# Altium footprint library My Footprint 3D.PCBLIB: 447 footprints (part 27 of 29)
Each footprint in its own frame and in the unit in brackets; x right, y up, seen from the top. Pads: shape width x height; smd on the part's side, far side on the other; paste and mask are expansions set on the pad; w line width, h text height; cw(c..) or ccw(c..) is an arc to the next point about the centre after c.
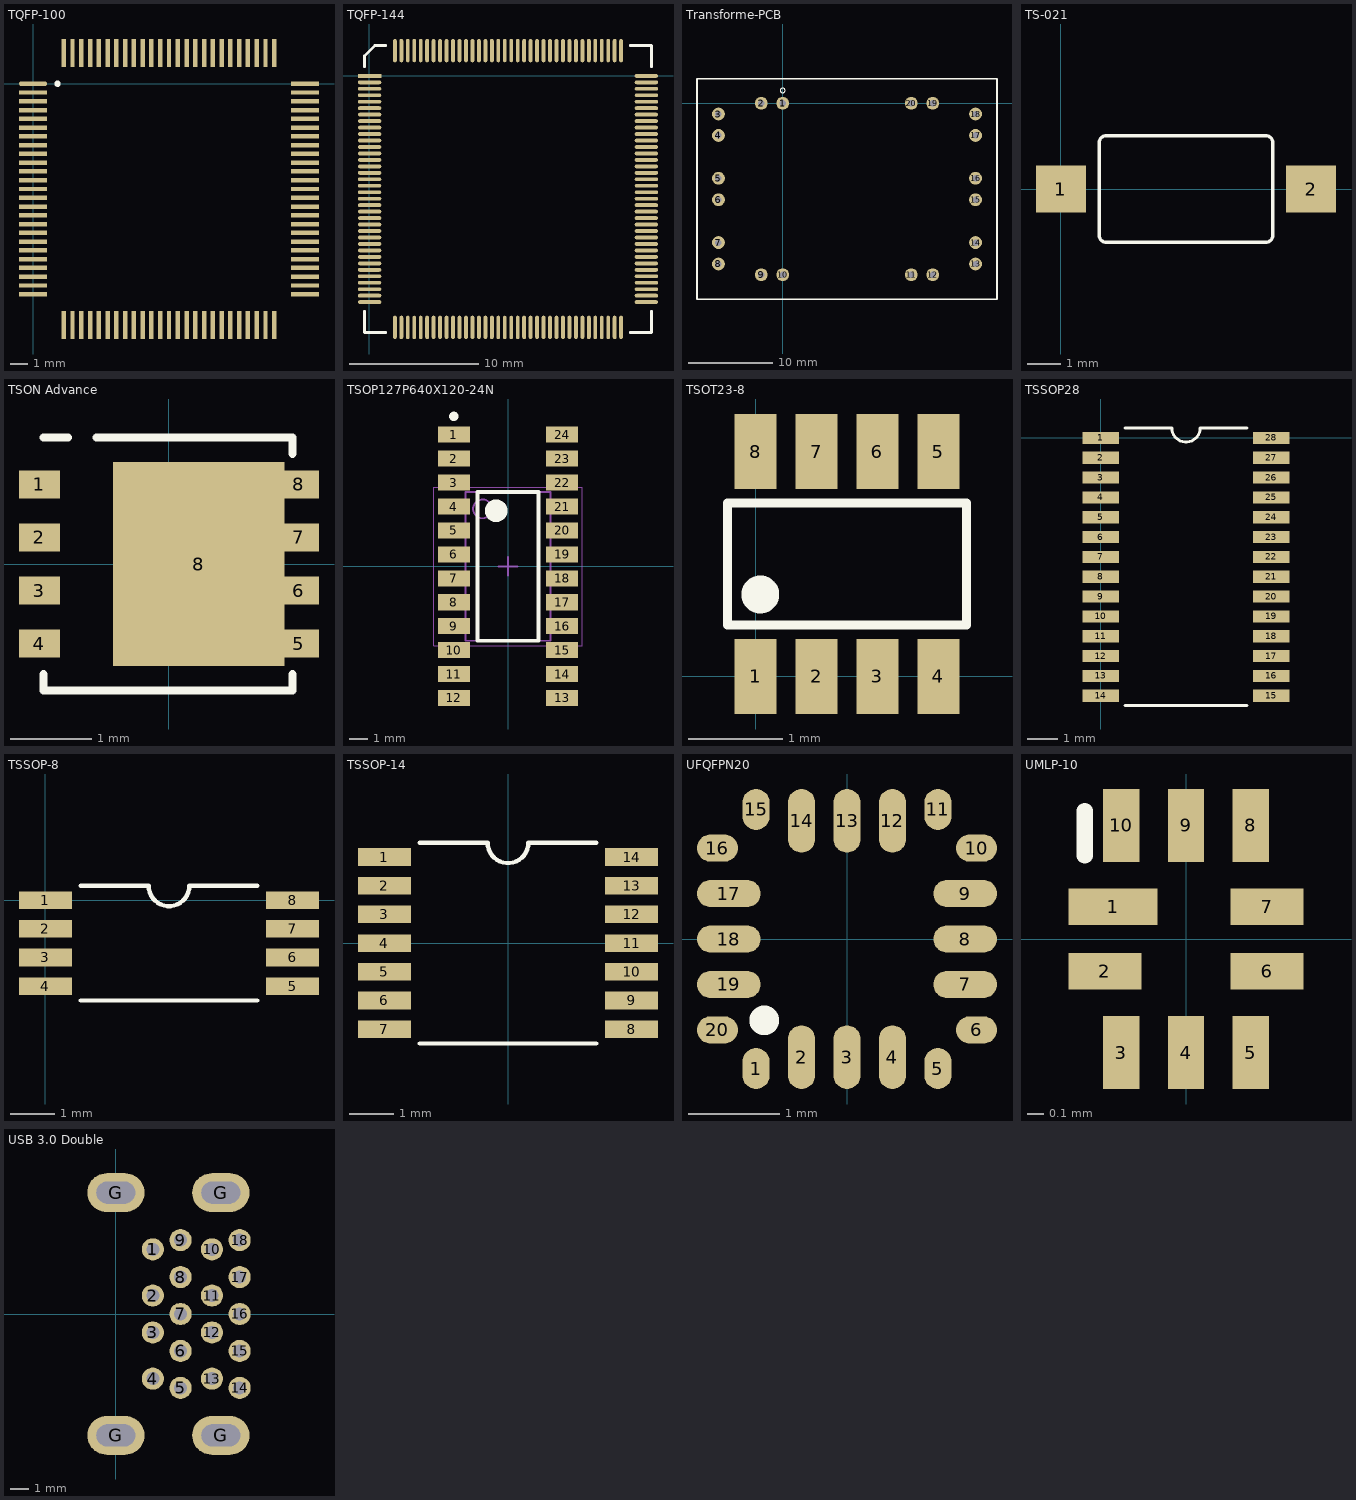
[diagram p26: the footprints below, top view; thin cyan lines are the x and y axes]

## TQFP-100 [mm]
pads (100):
  oval 1.6x0.254 smd: 1(0,0)
  rect 1.6x0.254 smd: 2(0,-0.5) 3(0,-1) 4(0,-1.5) 5(0,-2) 6(0,-2.5) 7(0,-3) 8(0,-3.5) 9(0,-4) 10(0,-4.5) 11(0,-5) 12(0,-5.5) 13(0,-6) 14(0,-6.5) 15(0,-7) 16(0,-7.5) 17(0,-8) 18(0,-8.5) 19(0,-9) 20(0,-9.5) 21(0,-10) 22(0,-10.5) 23(0,-11) 24(0,-11.5) 25(0,-12) 51(15.5,-12) 52(15.5,-11.5) 53(15.5,-11) 54(15.5,-10.5) 55(15.5,-10) 56(15.5,-9.5) 57(15.5,-9) 58(15.5,-8.5) 59(15.5,-8) 60(15.5,-7.5) 61(15.5,-7) 62(15.5,-6.5) 63(15.5,-6) 64(15.5,-5.5) 65(15.5,-5) 66(15.5,-4.5) 67(15.5,-4) 68(15.5,-3.5) 69(15.5,-3) 70(15.5,-2.5) 71(15.5,-2) 72(15.5,-1.5) 73(15.5,-1) 74(15.5,-0.5) 75(15.5,0)
  rect 0.254x1.6 smd: 26(1.75,-13.75) 27(2.25,-13.75) 28(2.75,-13.75) 29(3.25,-13.75) 30(3.75,-13.75) 31(4.25,-13.75) 32(4.75,-13.75) 33(5.25,-13.75) 34(5.75,-13.75) 35(6.25,-13.75) 36(6.75,-13.75) 37(7.25,-13.75) 38(7.75,-13.75) 39(8.25,-13.75) 40(8.75,-13.75) 41(9.25,-13.75) 42(9.75,-13.75) 43(10.25,-13.75) 44(10.75,-13.75) 45(11.25,-13.75) 46(11.75,-13.75) 47(12.25,-13.75) 48(12.75,-13.75) 49(13.25,-13.75) 50(13.75,-13.75) 76(13.75,1.75) 77(13.25,1.75) 78(12.75,1.75) 79(12.25,1.75) 80(11.75,1.75) 81(11.25,1.75) 82(10.75,1.75) 83(10.25,1.75) 84(9.75,1.75) 85(9.25,1.75) 86(8.75,1.75) 87(8.25,1.75) 88(7.75,1.75) 89(7.25,1.75) 90(6.75,1.75) 91(6.25,1.75) 92(5.75,1.75) 93(5.25,1.75) 94(4.75,1.75) 95(4.25,1.75) 96(3.75,1.75) 97(3.25,1.75) 98(2.75,1.75) 99(2.25,1.75) 100(1.75,1.75)
Top Overlay:
  circle w0.2: c1.396,0 r0.079
3D body: height 0.75, standoff 0.45, extent 13.648,0.975 13.852,1.35
3D body: height 0.75, standoff 0, extent 13.648,1.35 13.852,1.528
3D body: height 0.2, standoff 0, extent 13.648,1.528 13.852,2.228
3D body: height 0.2, standoff 0, extent 13.148,1.528 13.352,2.228
3D body: height 0.75, standoff 0, extent 13.148,1.35 13.352,1.528
3D body: height 0.75, standoff 0.45, extent 13.148,0.975 13.352,1.35
3D body: height 0.2, standoff 0, extent 12.648,1.528 12.852,2.228
3D body: height 0.75, standoff 0, extent 12.648,1.35 12.852,1.528
3D body: height 0.75, standoff 0.45, extent 12.648,0.975 12.852,1.35
3D body: height 0.2, standoff 0, extent 12.148,1.528 12.352,2.228
3D body: height 0.75, standoff 0, extent 12.148,1.35 12.352,1.528
3D body: height 0.75, standoff 0.45, extent 12.148,0.975 12.352,1.35
3D body: height 0.2, standoff 0, extent 11.648,1.528 11.852,2.228
3D body: height 0.75, standoff 0, extent 11.648,1.35 11.852,1.528
3D body: height 0.75, standoff 0.45, extent 11.648,0.975 11.852,1.35
3D body: height 0.75, standoff 0.45, extent 9.148,0.975 9.352,1.35
3D body: height 0.75, standoff 0, extent 9.148,1.35 9.352,1.528
3D body: height 0.2, standoff 0, extent 9.148,1.528 9.352,2.228
3D body: height 0.75, standoff 0.45, extent 9.648,0.975 9.852,1.35
3D body: height 0.75, standoff 0, extent 9.648,1.35 9.852,1.528
3D body: height 0.2, standoff 0, extent 9.648,1.528 9.852,2.228
3D body: height 0.75, standoff 0.45, extent 10.148,0.975 10.352,1.35
3D body: height 0.75, standoff 0, extent 10.148,1.35 10.352,1.528
3D body: height 0.2, standoff 0, extent 10.148,1.528 10.352,2.228
3D body: height 0.75, standoff 0.45, extent 10.648,0.975 10.852,1.35
3D body: height 0.75, standoff 0, extent 10.648,1.35 10.852,1.528
3D body: height 0.2, standoff 0, extent 10.648,1.528 10.852,2.228
3D body: height 0.2, standoff 0, extent 11.148,1.528 11.352,2.228
3D body: height 0.75, standoff 0, extent 11.148,1.35 11.352,1.528
3D body: height 0.75, standoff 0.45, extent 11.148,0.975 11.352,1.35
3D body: height 0.75, standoff 0.45, extent 6.648,0.975 6.852,1.35
3D body: height 0.75, standoff 0, extent 6.648,1.35 6.852,1.528
3D body: height 0.2, standoff 0, extent 6.648,1.528 6.852,2.228
3D body: height 0.75, standoff 0.45, extent 7.148,0.975 7.352,1.35
3D body: height 0.75, standoff 0, extent 7.148,1.35 7.352,1.528
3D body: height 0.2, standoff 0, extent 7.148,1.528 7.352,2.228
3D body: height 0.75, standoff 0.45, extent 7.648,0.975 7.852,1.35
3D body: height 0.75, standoff 0, extent 7.648,1.35 7.852,1.528
3D body: height 0.2, standoff 0, extent 7.648,1.528 7.852,2.228
3D body: height 0.75, standoff 0.45, extent 8.148,0.975 8.352,1.35
3D body: height 0.75, standoff 0, extent 8.148,1.35 8.352,1.528
3D body: height 0.2, standoff 0, extent 8.148,1.528 8.352,2.228
3D body: height 0.2, standoff 0, extent 8.648,1.528 8.852,2.228
3D body: height 0.75, standoff 0, extent 8.648,1.35 8.852,1.528
3D body: height 0.75, standoff 0.45, extent 8.648,0.975 8.852,1.35
3D body: height 0.75, standoff 0.45, extent 4.148,0.975 4.352,1.35
3D body: height 0.75, standoff 0, extent 4.148,1.35 4.352,1.528
3D body: height 0.2, standoff 0, extent 4.148,1.528 4.352,2.228
3D body: height 0.75, standoff 0.45, extent 4.648,0.975 4.852,1.35
3D body: height 0.75, standoff 0, extent 4.648,1.35 4.852,1.528
3D body: height 0.2, standoff 0, extent 4.648,1.528 4.852,2.228
3D body: height 0.75, standoff 0.45, extent 5.148,0.975 5.352,1.35
3D body: height 0.75, standoff 0, extent 5.148,1.35 5.352,1.528
3D body: height 0.2, standoff 0, extent 5.148,1.528 5.352,2.228
3D body: height 0.75, standoff 0.45, extent 5.648,0.975 5.852,1.35
3D body: height 0.75, standoff 0, extent 5.648,1.35 5.852,1.528
3D body: height 0.2, standoff 0, extent 5.648,1.528 5.852,2.228
3D body: height 0.2, standoff 0, extent 6.148,1.528 6.352,2.228
3D body: height 0.75, standoff 0, extent 6.148,1.35 6.352,1.528
3D body: height 0.75, standoff 0.45, extent 6.148,0.975 6.352,1.35
3D body: height 0.75, standoff 0.45, extent 1.648,0.975 1.852,1.35
3D body: height 0.75, standoff 0, extent 1.648,1.35 1.852,1.528
3D body: height 0.2, standoff 0, extent 1.648,1.528 1.852,2.228
3D body: height 0.75, standoff 0.45, extent 2.148,0.975 2.352,1.35
3D body: height 0.75, standoff 0, extent 2.148,1.35 2.352,1.528
3D body: height 0.2, standoff 0, extent 2.148,1.528 2.352,2.228
3D body: height 0.75, standoff 0.45, extent 2.648,0.975 2.852,1.35
3D body: height 0.75, standoff 0, extent 2.648,1.35 2.852,1.528
3D body: height 0.2, standoff 0, extent 2.648,1.528 2.852,2.228
3D body: height 0.75, standoff 0.45, extent 3.148,0.975 3.352,1.35
3D body: height 0.75, standoff 0, extent 3.148,1.35 3.352,1.528
3D body: height 0.2, standoff 0, extent 3.148,1.528 3.352,2.228
3D body: height 0.2, standoff 0, extent 3.648,1.528 3.852,2.228
3D body: height 0.75, standoff 0, extent 3.648,1.35 3.852,1.528
3D body: height 0.75, standoff 0.45, extent 3.648,0.975 3.852,1.35
3D body: height 0.75, standoff 0.45, extent 14.725,-12.102 15.1,-11.898
3D body: height 0.75, standoff 0, extent 15.1,-12.102 15.278,-11.898
3D body: height 0.2, standoff 0, extent 15.278,-12.102 15.978,-11.898
3D body: height 0.2, standoff 0, extent 15.278,-11.602 15.978,-11.398
3D body: height 0.75, standoff 0, extent 15.1,-11.602 15.278,-11.398
3D body: height 0.75, standoff 0.45, extent 14.725,-11.602 15.1,-11.398
3D body: height 0.2, standoff 0, extent 15.278,-11.102 15.978,-10.898
3D body: height 0.75, standoff 0, extent 15.1,-11.102 15.278,-10.898
3D body: height 0.75, standoff 0.45, extent 14.725,-11.102 15.1,-10.898
3D body: height 0.2, standoff 0, extent 15.278,-10.602 15.978,-10.398
3D body: height 0.75, standoff 0, extent 15.1,-10.602 15.278,-10.398
3D body: height 0.75, standoff 0.45, extent 14.725,-10.602 15.1,-10.398
3D body: height 0.2, standoff 0, extent 15.278,-10.102 15.978,-9.898
3D body: height 0.75, standoff 0, extent 15.1,-10.102 15.278,-9.898
3D body: height 0.75, standoff 0.45, extent 14.725,-10.102 15.1,-9.898
3D body: height 0.75, standoff 0.45, extent 14.725,-7.602 15.1,-7.398
3D body: height 0.75, standoff 0, extent 15.1,-7.602 15.278,-7.398
3D body: height 0.2, standoff 0, extent 15.278,-7.602 15.978,-7.398
3D body: height 0.75, standoff 0.45, extent 14.725,-8.102 15.1,-7.898
3D body: height 0.75, standoff 0, extent 15.1,-8.102 15.278,-7.898
3D body: height 0.2, standoff 0, extent 15.278,-8.102 15.978,-7.898
3D body: height 0.75, standoff 0.45, extent 14.725,-8.602 15.1,-8.398
3D body: height 0.75, standoff 0, extent 15.1,-8.602 15.278,-8.398
3D body: height 0.2, standoff 0, extent 15.278,-8.602 15.978,-8.398
3D body: height 0.75, standoff 0.45, extent 14.725,-9.102 15.1,-8.898
3D body: height 0.75, standoff 0, extent 15.1,-9.102 15.278,-8.898
3D body: height 0.2, standoff 0, extent 15.278,-9.102 15.978,-8.898
3D body: height 0.2, standoff 0, extent 15.278,-9.602 15.978,-9.398
3D body: height 0.75, standoff 0, extent 15.1,-9.602 15.278,-9.398
3D body: height 0.75, standoff 0.45, extent 14.725,-9.602 15.1,-9.398
3D body: height 0.75, standoff 0.45, extent 14.725,-5.102 15.1,-4.898
3D body: height 0.75, standoff 0, extent 15.1,-5.102 15.278,-4.898
3D body: height 0.2, standoff 0, extent 15.278,-5.102 15.978,-4.898
3D body: height 0.75, standoff 0.45, extent 14.725,-5.602 15.1,-5.398
3D body: height 0.75, standoff 0, extent 15.1,-5.602 15.278,-5.398
3D body: height 0.2, standoff 0, extent 15.278,-5.602 15.978,-5.398
3D body: height 0.75, standoff 0.45, extent 14.725,-6.102 15.1,-5.898
3D body: height 0.75, standoff 0, extent 15.1,-6.102 15.278,-5.898
3D body: height 0.2, standoff 0, extent 15.278,-6.102 15.978,-5.898
3D body: height 0.75, standoff 0.45, extent 14.725,-6.602 15.1,-6.398
3D body: height 0.75, standoff 0, extent 15.1,-6.602 15.278,-6.398
3D body: height 0.2, standoff 0, extent 15.278,-6.602 15.978,-6.398
3D body: height 0.2, standoff 0, extent 15.278,-7.102 15.978,-6.898
3D body: height 0.75, standoff 0, extent 15.1,-7.102 15.278,-6.898
3D body: height 0.75, standoff 0.45, extent 14.725,-7.102 15.1,-6.898
3D body: height 0.75, standoff 0.45, extent 14.725,-2.602 15.1,-2.398
3D body: height 0.75, standoff 0, extent 15.1,-2.602 15.278,-2.398
3D body: height 0.2, standoff 0, extent 15.278,-2.602 15.978,-2.398
3D body: height 0.75, standoff 0.45, extent 14.725,-3.102 15.1,-2.898
3D body: height 0.75, standoff 0, extent 15.1,-3.102 15.278,-2.898
3D body: height 0.2, standoff 0, extent 15.278,-3.102 15.978,-2.898
3D body: height 0.75, standoff 0.45, extent 14.725,-3.602 15.1,-3.398
3D body: height 0.75, standoff 0, extent 15.1,-3.602 15.278,-3.398
3D body: height 0.2, standoff 0, extent 15.278,-3.602 15.978,-3.398
3D body: height 0.75, standoff 0.45, extent 14.725,-4.102 15.1,-3.898
3D body: height 0.75, standoff 0, extent 15.1,-4.102 15.278,-3.898
3D body: height 0.2, standoff 0, extent 15.278,-4.102 15.978,-3.898
3D body: height 0.2, standoff 0, extent 15.278,-4.602 15.978,-4.398
3D body: height 0.75, standoff 0, extent 15.1,-4.602 15.278,-4.398
3D body: height 0.75, standoff 0.45, extent 14.725,-4.602 15.1,-4.398
3D body: height 0.75, standoff 0.45, extent 14.725,-0.102 15.1,0.102
3D body: height 0.75, standoff 0, extent 15.1,-0.102 15.278,0.102
3D body: height 0.2, standoff 0, extent 15.278,-0.102 15.978,0.102
3D body: height 0.75, standoff 0.45, extent 14.725,-0.602 15.1,-0.398
3D body: height 0.75, standoff 0, extent 15.1,-0.602 15.278,-0.398
3D body: height 0.2, standoff 0, extent 15.278,-0.602 15.978,-0.398
3D body: height 0.75, standoff 0.45, extent 14.725,-1.102 15.1,-0.898
3D body: height 0.75, standoff 0, extent 15.1,-1.102 15.278,-0.898
3D body: height 0.2, standoff 0, extent 15.278,-1.102 15.978,-0.898
3D body: height 0.75, standoff 0.45, extent 14.725,-1.602 15.1,-1.398
3D body: height 0.75, standoff 0, extent 15.1,-1.602 15.278,-1.398
3D body: height 0.2, standoff 0, extent 15.278,-1.602 15.978,-1.398
3D body: height 0.2, standoff 0, extent 15.278,-2.102 15.978,-1.898
3D body: height 0.75, standoff 0, extent 15.1,-2.102 15.278,-1.898
3D body: height 0.75, standoff 0.45, extent 14.725,-2.102 15.1,-1.898
3D body: height 0.75, standoff 0.45, extent 1.648,-13.35 1.852,-12.975
3D body: height 0.75, standoff 0, extent 1.648,-13.528 1.852,-13.35
3D body: height 0.2, standoff 0, extent 1.648,-14.228 1.852,-13.528
3D body: height 0.2, standoff 0, extent 2.148,-14.228 2.352,-13.528
3D body: height 0.75, standoff 0, extent 2.148,-13.528 2.352,-13.35
3D body: height 0.75, standoff 0.45, extent 2.148,-13.35 2.352,-12.975
3D body: height 0.2, standoff 0, extent 2.648,-14.228 2.852,-13.528
3D body: height 0.75, standoff 0, extent 2.648,-13.528 2.852,-13.35
3D body: height 0.75, standoff 0.45, extent 2.648,-13.35 2.852,-12.975
3D body: height 0.2, standoff 0, extent 3.148,-14.228 3.352,-13.528
3D body: height 0.75, standoff 0, extent 3.148,-13.528 3.352,-13.35
3D body: height 0.75, standoff 0.45, extent 3.148,-13.35 3.352,-12.975
3D body: height 0.2, standoff 0, extent 3.648,-14.228 3.852,-13.528
3D body: height 0.75, standoff 0, extent 3.648,-13.528 3.852,-13.35
3D body: height 0.75, standoff 0.45, extent 3.648,-13.35 3.852,-12.975
3D body: height 0.75, standoff 0.45, extent 6.148,-13.35 6.352,-12.975
3D body: height 0.75, standoff 0, extent 6.148,-13.528 6.352,-13.35
3D body: height 0.2, standoff 0, extent 6.148,-14.228 6.352,-13.528
3D body: height 0.75, standoff 0.45, extent 5.648,-13.35 5.852,-12.975
3D body: height 0.75, standoff 0, extent 5.648,-13.528 5.852,-13.35
3D body: height 0.2, standoff 0, extent 5.648,-14.228 5.852,-13.528
3D body: height 0.75, standoff 0.45, extent 5.148,-13.35 5.352,-12.975
3D body: height 0.75, standoff 0, extent 5.148,-13.528 5.352,-13.35
3D body: height 0.2, standoff 0, extent 5.148,-14.228 5.352,-13.528
3D body: height 0.75, standoff 0.45, extent 4.648,-13.35 4.852,-12.975
3D body: height 0.75, standoff 0, extent 4.648,-13.528 4.852,-13.35
3D body: height 0.2, standoff 0, extent 4.648,-14.228 4.852,-13.528
3D body: height 0.2, standoff 0, extent 4.148,-14.228 4.352,-13.528
3D body: height 0.75, standoff 0, extent 4.148,-13.528 4.352,-13.35
3D body: height 0.75, standoff 0.45, extent 4.148,-13.35 4.352,-12.975
3D body: height 0.75, standoff 0.45, extent 8.648,-13.35 8.852,-12.975
3D body: height 0.75, standoff 0, extent 8.648,-13.528 8.852,-13.35
3D body: height 0.2, standoff 0, extent 8.648,-14.228 8.852,-13.528
3D body: height 0.75, standoff 0.45, extent 8.148,-13.35 8.352,-12.975
3D body: height 0.75, standoff 0, extent 8.148,-13.528 8.352,-13.35
3D body: height 0.2, standoff 0, extent 8.148,-14.228 8.352,-13.528
3D body: height 0.75, standoff 0.45, extent 7.648,-13.35 7.852,-12.975
3D body: height 0.75, standoff 0, extent 7.648,-13.528 7.852,-13.35
3D body: height 0.2, standoff 0, extent 7.648,-14.228 7.852,-13.528
3D body: height 0.75, standoff 0.45, extent 7.148,-13.35 7.352,-12.975
3D body: height 0.75, standoff 0, extent 7.148,-13.528 7.352,-13.35
3D body: height 0.2, standoff 0, extent 7.148,-14.228 7.352,-13.528
3D body: height 0.2, standoff 0, extent 6.648,-14.228 6.852,-13.528
3D body: height 0.75, standoff 0, extent 6.648,-13.528 6.852,-13.35
3D body: height 0.75, standoff 0.45, extent 6.648,-13.35 6.852,-12.975
3D body: height 0.75, standoff 0.45, extent 11.148,-13.35 11.352,-12.975
3D body: height 0.75, standoff 0, extent 11.148,-13.528 11.352,-13.35
3D body: height 0.2, standoff 0, extent 11.148,-14.228 11.352,-13.528
3D body: height 0.75, standoff 0.45, extent 10.648,-13.35 10.852,-12.975
3D body: height 0.75, standoff 0, extent 10.648,-13.528 10.852,-13.35
3D body: height 0.2, standoff 0, extent 10.648,-14.228 10.852,-13.528
3D body: height 0.75, standoff 0.45, extent 10.148,-13.35 10.352,-12.975
3D body: height 0.75, standoff 0, extent 10.148,-13.528 10.352,-13.35
3D body: height 0.2, standoff 0, extent 10.148,-14.228 10.352,-13.528
3D body: height 0.75, standoff 0.45, extent 9.648,-13.35 9.852,-12.975
3D body: height 0.75, standoff 0, extent 9.648,-13.528 9.852,-13.35
3D body: height 0.2, standoff 0, extent 9.648,-14.228 9.852,-13.528
3D body: height 0.2, standoff 0, extent 9.148,-14.228 9.352,-13.528
3D body: height 0.75, standoff 0, extent 9.148,-13.528 9.352,-13.35
3D body: height 0.75, standoff 0.45, extent 9.148,-13.35 9.352,-12.975
3D body: height 0.75, standoff 0.45, extent 13.648,-13.35 13.852,-12.975
3D body: height 0.75, standoff 0, extent 13.648,-13.528 13.852,-13.35
3D body: height 0.2, standoff 0, extent 13.648,-14.228 13.852,-13.528
3D body: height 0.75, standoff 0.45, extent 13.148,-13.35 13.352,-12.975
3D body: height 0.75, standoff 0, extent 13.148,-13.528 13.352,-13.35
3D body: height 0.2, standoff 0, extent 13.148,-14.228 13.352,-13.528
3D body: height 0.75, standoff 0.45, extent 12.648,-13.35 12.852,-12.975
3D body: height 0.75, standoff 0, extent 12.648,-13.528 12.852,-13.35
3D body: height 0.2, standoff 0, extent 12.648,-14.228 12.852,-13.528
3D body: height 0.75, standoff 0.45, extent 12.148,-13.35 12.352,-12.975
3D body: height 0.75, standoff 0, extent 12.148,-13.528 12.352,-13.35
3D body: height 0.2, standoff 0, extent 12.148,-14.228 12.352,-13.528
3D body: height 0.2, standoff 0, extent 11.648,-14.228 11.852,-13.528
3D body: height 0.75, standoff 0, extent 11.648,-13.528 11.852,-13.35
3D body: height 0.75, standoff 0.45, extent 11.648,-13.35 11.852,-12.975
3D body: height 0.75, standoff 0.45, extent 0.4,-10.102 0.775,-9.898
3D body: height 0.75, standoff 0, extent 0.222,-10.102 0.4,-9.898
3D body: height 0.2, standoff 0, extent -0.478,-10.102 0.222,-9.898
3D body: height 0.2, standoff 0, extent -0.478,-10.602 0.222,-10.398
3D body: height 0.75, standoff 0, extent 0.222,-10.602 0.4,-10.398
3D body: height 0.75, standoff 0.45, extent 0.4,-10.602 0.775,-10.398
3D body: height 0.2, standoff 0, extent -0.478,-11.102 0.222,-10.898
3D body: height 0.75, standoff 0, extent 0.222,-11.102 0.4,-10.898
3D body: height 0.75, standoff 0.45, extent 0.4,-11.102 0.775,-10.898
3D body: height 0.2, standoff 0, extent -0.478,-11.602 0.222,-11.398
3D body: height 0.75, standoff 0, extent 0.222,-11.602 0.4,-11.398
3D body: height 0.75, standoff 0.45, extent 0.4,-11.602 0.775,-11.398
3D body: height 0.2, standoff 0, extent -0.478,-12.102 0.222,-11.898
3D body: height 0.75, standoff 0, extent 0.222,-12.102 0.4,-11.898
3D body: height 0.75, standoff 0.45, extent 0.4,-12.102 0.775,-11.898
3D body: height 0.75, standoff 0.45, extent 0.4,-7.602 0.775,-7.398
3D body: height 0.75, standoff 0, extent 0.222,-7.602 0.4,-7.398
3D body: height 0.2, standoff 0, extent -0.478,-7.602 0.222,-7.398
3D body: height 0.2, standoff 0, extent -0.478,-8.102 0.222,-7.898
3D body: height 0.75, standoff 0, extent 0.222,-8.102 0.4,-7.898
3D body: height 0.75, standoff 0.45, extent 0.4,-8.102 0.775,-7.898
3D body: height 0.2, standoff 0, extent -0.478,-8.602 0.222,-8.398
3D body: height 0.75, standoff 0, extent 0.222,-8.602 0.4,-8.398
3D body: height 0.75, standoff 0.45, extent 0.4,-8.602 0.775,-8.398
3D body: height 0.2, standoff 0, extent -0.478,-9.102 0.222,-8.898
3D body: height 0.75, standoff 0, extent 0.222,-9.102 0.4,-8.898
3D body: height 0.75, standoff 0.45, extent 0.4,-9.102 0.775,-8.898
3D body: height 0.2, standoff 0, extent -0.478,-9.602 0.222,-9.398
3D body: height 0.75, standoff 0, extent 0.222,-9.602 0.4,-9.398
3D body: height 0.75, standoff 0.45, extent 0.4,-9.602 0.775,-9.398
3D body: height 0.75, standoff 0.45, extent 0.4,-5.102 0.775,-4.898
3D body: height 0.75, standoff 0, extent 0.222,-5.102 0.4,-4.898
3D body: height 0.2, standoff 0, extent -0.478,-5.102 0.222,-4.898
3D body: height 0.2, standoff 0, extent -0.478,-5.602 0.222,-5.398
3D body: height 0.75, standoff 0, extent 0.222,-5.602 0.4,-5.398
3D body: height 0.75, standoff 0.45, extent 0.4,-5.602 0.775,-5.398
3D body: height 0.2, standoff 0, extent -0.478,-6.102 0.222,-5.898
3D body: height 0.75, standoff 0, extent 0.222,-6.102 0.4,-5.898
3D body: height 0.75, standoff 0.45, extent 0.4,-6.102 0.775,-5.898
3D body: height 0.2, standoff 0, extent -0.478,-6.602 0.222,-6.398
3D body: height 0.75, standoff 0, extent 0.222,-6.602 0.4,-6.398
3D body: height 0.75, standoff 0.45, extent 0.4,-6.602 0.775,-6.398
3D body: height 0.2, standoff 0, extent -0.478,-7.102 0.222,-6.898
3D body: height 0.75, standoff 0, extent 0.222,-7.102 0.4,-6.898
3D body: height 0.75, standoff 0.45, extent 0.4,-7.102 0.775,-6.898
3D body: height 0.75, standoff 0.45, extent 0.4,-2.602 0.775,-2.398
3D body: height 0.75, standoff 0, extent 0.222,-2.602 0.4,-2.398
3D body: height 0.2, standoff 0, extent -0.478,-2.602 0.222,-2.398
3D body: height 0.2, standoff 0, extent -0.478,-3.102 0.222,-2.898
3D body: height 0.75, standoff 0, extent 0.222,-3.102 0.4,-2.898
3D body: height 0.75, standoff 0.45, extent 0.4,-3.102 0.775,-2.898
3D body: height 0.2, standoff 0, extent -0.478,-3.602 0.222,-3.398
3D body: height 0.75, standoff 0, extent 0.222,-3.602 0.4,-3.398
3D body: height 0.75, standoff 0.45, extent 0.4,-3.602 0.775,-3.398
3D body: height 0.2, standoff 0, extent -0.478,-4.102 0.222,-3.898
3D body: height 0.75, standoff 0, extent 0.222,-4.102 0.4,-3.898
3D body: height 0.75, standoff 0.45, extent 0.4,-4.102 0.775,-3.898
3D body: height 0.2, standoff 0, extent -0.478,-4.602 0.222,-4.398
3D body: height 0.75, standoff 0, extent 0.222,-4.602 0.4,-4.398
3D body: height 0.75, standoff 0.45, extent 0.4,-4.602 0.775,-4.398
3D body: height 0.75, standoff 0.45, extent 0.4,-2.102 0.775,-1.898
3D body: height 0.75, standoff 0, extent 0.222,-2.102 0.4,-1.898
3D body: height 0.2, standoff 0, extent -0.478,-2.102 0.222,-1.898
3D body: height 0.75, standoff 0.45, extent 0.4,-1.602 0.775,-1.398
3D body: height 0.75, standoff 0, extent 0.222,-1.602 0.4,-1.398
3D body: height 0.2, standoff 0, extent -0.478,-1.602 0.222,-1.398
3D body: height 0.75, standoff 0.45, extent 0.4,-1.102 0.775,-0.898
3D body: height 0.75, standoff 0, extent 0.222,-1.102 0.4,-0.898
3D body: height 0.2, standoff 0, extent -0.478,-1.102 0.222,-0.898
3D body: height 0.75, standoff 0.45, extent 0.4,-0.602 0.775,-0.398
3D body: height 0.75, standoff 0, extent 0.222,-0.602 0.4,-0.398
3D body: height 0.2, standoff 0, extent -0.478,-0.602 0.222,-0.398
3D body: height 1.3, standoff 0.1, extent 0.75,-13 14.75,1
3D body: height 0.2, standoff 0, extent -0.478,-0.102 0.222,0.102
3D body: height 0.75, standoff 0, extent 0.222,-0.102 0.4,0.102
3D body: height 0.75, standoff 0.45, extent 0.4,-0.102 0.775,0.102
3D body: height 1.61, standoff 0.3, extent 1.4,-0.2 1.998,0.399

## TQFP-144 [mm]
height 2.45
pads (144):
  rect 1.8x0.3 smd: 1(0.012,0.01)
  oval 1.8x0.3 smd: 2(0.012,-0.49) 3(0.012,-0.99) 4(0.012,-1.49) 5(0.012,-1.99) 6(0.012,-2.49) 7(0.012,-2.99) 8(0.012,-3.49) 9(0.012,-3.99) 10(0.012,-4.49) 11(0.012,-4.99) 12(0.012,-5.49) 13(0.012,-5.99) 14(0.012,-6.49) 15(0.012,-6.99) 16(0.012,-7.49) 17(0.012,-7.99) 18(0.012,-8.49) 19(0.012,-8.99) 20(0.012,-9.49) 21(0.012,-9.99) 22(0.012,-10.49) 23(0.012,-10.99) 24(0.012,-11.49) 25(0.012,-11.99) 26(0.012,-12.49) 27(0.012,-12.99) 28(0.012,-13.49) 29(0.012,-13.99) 30(0.012,-14.49) 31(0.012,-14.99) 32(0.012,-15.49) 33(0.012,-15.99) 34(0.012,-16.49) 35(0.012,-16.99) 36(0.012,-17.49) 73(21.412,-17.49) 74(21.412,-16.99) 75(21.412,-16.49) 76(21.412,-15.99) 77(21.412,-15.49) 78(21.412,-14.99) 79(21.412,-14.49) 80(21.412,-13.99) 81(21.412,-13.49) 82(21.412,-12.99) 83(21.412,-12.49) 84(21.412,-11.99) 85(21.412,-11.49) 86(21.412,-10.99) 87(21.412,-10.49) 88(21.412,-9.99) 89(21.412,-9.49) 90(21.412,-8.99) 91(21.412,-8.49) 92(21.412,-7.99) 93(21.412,-7.49) 94(21.412,-6.99) 95(21.412,-6.49) 96(21.412,-5.99) 97(21.412,-5.49) 98(21.412,-4.99) 99(21.412,-4.49) 100(21.412,-3.99) 101(21.412,-3.49) 102(21.412,-2.99) 103(21.412,-2.49) 104(21.412,-1.99) 105(21.412,-1.49) 106(21.412,-0.99) 107(21.412,-0.49) 108(21.412,0.01)
  oval 0.3x1.8 smd: 37(1.962,-19.44) 38(2.462,-19.44) 39(2.962,-19.44) 40(3.462,-19.44) 41(3.962,-19.44) 42(4.462,-19.44) 43(4.962,-19.44) 44(5.462,-19.44) 45(5.962,-19.44) 46(6.462,-19.44) 47(6.962,-19.44) 48(7.462,-19.44) 49(7.962,-19.44) 50(8.462,-19.44) 51(8.962,-19.44) 52(9.462,-19.44) 53(9.962,-19.44) 54(10.462,-19.44) 55(10.962,-19.44) 56(11.462,-19.44) 57(11.962,-19.44) 58(12.462,-19.44) 59(12.962,-19.44) 60(13.462,-19.44) 61(13.962,-19.44) 62(14.462,-19.44) 63(14.962,-19.44) 64(15.462,-19.44) 65(15.962,-19.44) 66(16.462,-19.44) 67(16.962,-19.44) 68(17.462,-19.44) 69(17.962,-19.44) 70(18.462,-19.44) 71(18.962,-19.44) 72(19.462,-19.44) 109(19.462,1.96) 110(18.962,1.96) 111(18.462,1.96) 112(17.962,1.96) 113(17.462,1.96) 114(16.962,1.96) 115(16.462,1.96) 116(15.962,1.96) 117(15.462,1.96) 118(14.962,1.96) 119(14.462,1.96) 120(13.962,1.96) 121(13.462,1.96) 122(12.962,1.96) 123(12.462,1.96) 124(11.962,1.96) 125(11.462,1.96) 126(10.962,1.96) 127(10.462,1.96) 128(9.962,1.96) 129(9.462,1.96) 130(8.962,1.96) 131(8.462,1.96) 132(7.962,1.96) 133(7.462,1.96) 134(6.962,1.96) 135(6.462,1.96) 136(5.962,1.96) 137(5.462,1.96) 138(4.962,1.96) 139(4.462,1.96) 140(3.962,1.96) 141(3.462,1.96) 142(2.962,1.96) 143(2.462,1.96) 144(1.962,1.96)
Top Overlay:
  lines w0.203: -0.388,-18.19 -0.388,-19.84 1.262,-19.84 ; -0.388,0.71 -0.388,1.56 0.412,2.36 1.262,2.36 ; 20.162,-19.84 21.812,-19.84 21.812,-18.19 ; 20.162,2.36 21.812,2.36 21.812,0.71

## Transforme-PCB [mil]
pads (20):
  round 60 hole 30: 1(0,0) 2(-100,0) 3(-300,-50) 4(-300,-150) 5(-300,-350) 6(-300,-450) 7(-300,-650) 8(-300,-750) 9(-100,-800) 10(0,-800) 11(600,-800) 12(700,-800) 13(900,-750) 14(900,-650) 15(900,-450) 16(900,-350) 17(900,-150) 18(900,-50) 19(700,0) 20(600,0)
Top Overlay:
  circle w5.51: c0,60 r11.18
  lines w7.87: -400,-915 -400,115 1000,115 1000,-915 -400,-915

## TS-021 [mm]
pads (2):
  rect 1.5x1.4 smd: 1(0,0) 2(7.5,0)
Top Overlay:
  lines w0.1: 1.15,-1.4 ccw(c1.35,-1.4) 1.35,-1.6 6.15,-1.6 ccw(c6.15,-1.4) 6.35,-1.4 6.35,1.4 ccw(c6.15,1.4) 6.15,1.6 1.35,1.6 ccw(c1.35,1.4) 1.15,1.4 1.15,-1.4
3D body: height 2.3, standoff 1.6, extent 2.4,-0.7 5.1,0.7
3D body: height 1.6, standoff 1.2, extent 1.75,-1.45 5.75,1.45
3D body: height 1.2, standoff 0, extent 1.15,-1.85 6.35,1.85
3D body: height 1.1, standoff 0, extent 0.75,-1.75 1.15,1.75
3D body: height 1.1, standoff 0, extent 6.35,-1.75 6.75,1.75
3D body: height 0.5, standoff 0.3, extent 6.75,-0.3 7.25,0.3
3D body: height 0.5, standoff 0, extent 7.15,-0.3 7.35,0.3
3D body: height 0.2, standoff 0, extent 7.35,-0.3 7.75,0.3
3D body: height 0.2, standoff 0, extent -0.252,-0.3 0.148,0.3
3D body: height 0.5, standoff 0, extent 0.148,-0.3 0.348,0.3
3D body: height 0.5, standoff 0.3, extent 0.248,-0.3 0.748,0.3

## TSON Advance [mm]
pads (9):
  rect 0.5x0.34 smd: 1(-1.587,0.975) 2(-1.587,0.325) 3(-1.587,-0.325) 4(-1.587,-0.975) 5(1.588,-0.975) 6(1.588,-0.325) 7(1.588,0.325) 8(1.588,0.975)
  rect 2.1x2.5 smd: 8(0.363,0)
Top Overlay:
  lines w0.1: -1.537,-1.55 -1.537,-1.35 ; -1.537,1.55 -1.237,1.55 ; -1.512,-1.55 1.488,-1.55 ; -0.887,1.55 1.488,1.55 1.513,1.55 1.513,1.35 ; 1.513,-1.55 1.513,-1.35
3D body: height 1.1, standoff 0, extent -1.662,-1.65 1.638,1.65
3D body: height 1.11, standoff 1.1, extent -1.312,0.9 -0.912,1.3
3D body: height 0.2, standoff 0, extent -1.687,0.825 -1.487,1.125
3D body: height 0.2, standoff 0, extent -1.687,0.175 -1.487,0.475
3D body: height 0.2, standoff 0, extent -1.687,-0.475 -1.487,-0.175
3D body: height 0.2, standoff 0, extent -1.687,-1.125 -1.487,-0.825
3D body: height 0.2, standoff 0, extent 1.463,-1.125 1.663,-0.825
3D body: height 0.2, standoff 0, extent 1.463,-0.475 1.663,-0.175
3D body: height 0.2, standoff 0, extent 1.463,0.175 1.663,0.475
3D body: height 0.2, standoff 0, extent 1.463,0.825 1.663,1.125

## TSOP127P640X120-24N [mm] "TSOP, 24-Leads, Body 7.80x4.40mm, Pitch 1.27mm, IPC Medium Density"
height 1.2
pads (24):
  rect 1.7x0.85 smd: 1(-2.875,6.985) 2(-2.875,5.715) 3(-2.875,4.445) 4(-2.875,3.175) 5(-2.875,1.905) 6(-2.875,0.635) 7(-2.875,-0.635) 8(-2.875,-1.905) 9(-2.875,-3.175) 10(-2.875,-4.445) 11(-2.875,-5.715) 12(-2.875,-6.985) 13(2.875,-6.985) 14(2.875,-5.715) 15(2.875,-4.445) 16(2.875,-3.175) 17(2.875,-1.905) 18(2.875,-0.635) 19(2.875,0.635) 20(2.875,1.905) 21(2.875,3.175) 22(2.875,4.445) 23(2.875,5.715) 24(2.875,6.985)
Top Overlay:
  circle w0.25: c-2.875,7.96 r0.125
  circle w0.6: c-0.625,2.95 r0.3
  lines w0.2: -1.625,-3.95 -1.625,3.95 1.625,3.95 1.625,-3.95 -1.625,-3.95
Mechanical 13:
  circle w0.1: c-1.35,3.05 r0.5
  lines w0.1: -2.25,-3.95 -2.25,3.95 2.25,3.95 2.25,-3.95 -2.25,-3.95
Mechanical 15:
  lines w0.05: -3.95,-4.2 -3.95,4.2 3.95,4.2 3.95,-4.2 -3.95,-4.2
  lines w0.1: -0.5,0 0.5,0 ; 0,-0.5 0,0.5
3D body: height 1.2, standoff 0.1, extent -2.25,-3.95 2.25,3.95

## TSOT23-8 [mm]
pads (8):
  rect 0.45x0.8 smd: 1(0,0) 2(0.65,0) 3(1.3,0) 4(1.95,0) 5(1.95,2.4) 6(1.3,2.4) 7(0.65,2.4) 8(0,2.4)
Top Overlay:
  circle w0.254: c0.05,0.875 r0.075
  lines w0.1: -0.3,0.55 -0.3,1.85 2.225,1.85 2.25,1.85 2.25,0.55 -0.275,0.55
3D body: height 1.46, standoff 1.45, extent -0.3,0.575 0.1,0.975
3D body: height 1.45, standoff 0.2, extent -0.525,0.4 2.475,2
3D body: height 0.2, standoff 0, extent -0.15,-0.3 0.15,0
3D body: height 1.1, standoff 0, extent -0.15,0 0.15,0.2
3D body: height 1.1, standoff 0.9, extent -0.15,0.2 0.15,0.4
3D body: height 1.1, standoff 0.9, extent 0.5,0.2 0.8,0.4
3D body: height 1.1, standoff 0, extent 0.5,0 0.8,0.2
3D body: height 0.2, standoff 0, extent 0.5,-0.3 0.8,0
3D body: height 1.1, standoff 0.9, extent 1.15,0.2 1.45,0.4
3D body: height 1.1, standoff 0, extent 1.15,0 1.45,0.2
3D body: height 0.2, standoff 0, extent 1.15,-0.3 1.45,0
3D body: height 1.1, standoff 0.9, extent 1.8,0.2 2.1,0.4
3D body: height 1.1, standoff 0, extent 1.8,0 2.1,0.2
3D body: height 0.2, standoff 0, extent 1.8,-0.3 2.1,0
3D body: height 1.1, standoff 0.9, extent 1.8,2 2.1,2.2
3D body: height 1.1, standoff 0, extent 1.8,2.2 2.1,2.4
3D body: height 0.2, standoff 0, extent 1.8,2.4 2.1,2.7
3D body: height 1.1, standoff 0.9, extent 1.15,2 1.45,2.2
3D body: height 1.1, standoff 0, extent 1.15,2.2 1.45,2.4
3D body: height 0.2, standoff 0, extent 1.15,2.4 1.45,2.7
3D body: height 1.1, standoff 0.9, extent 0.5,2 0.8,2.2
3D body: height 1.1, standoff 0, extent 0.5,2.2 0.8,2.4
3D body: height 0.2, standoff 0, extent 0.5,2.4 0.8,2.7
3D body: height 1.1, standoff 0.9, extent -0.15,2 0.15,2.2
3D body: height 1.1, standoff 0, extent -0.15,2.2 0.15,2.4
3D body: height 0.2, standoff 0, extent -0.15,2.4 0.15,2.7

## TSSOP28 [mm]
pads (28):
  rect 1.2x0.4 smd: 1(0,0) 2(0,-0.65) 3(0,-1.3) 4(0,-1.95) 5(0,-2.601) 6(0,-3.251) 7(0,-3.901) 8(0,-4.551) 9(0,-5.201) 10(0,-5.851) 11(0,-6.502) 12(0,-7.152) 13(0,-7.802) 14(0,-8.452) 15(5.6,-8.452) 16(5.6,-7.802) 17(5.6,-7.152) 18(5.6,-6.502) 19(5.6,-5.851) 20(5.6,-5.201) 21(5.6,-4.551) 22(5.6,-3.901) 23(5.6,-3.251) 24(5.6,-2.601) 25(5.6,-1.95) 26(5.6,-1.3) 27(5.6,-0.65) 28(5.6,0)
Top Overlay:
  lines w0.1: 0.8,-8.777 2.8,-8.777 4.8,-8.777 ; 0.8,0.325 2.338,0.325 ccw(c2.8,0.325) 3.262,0.325 4.8,0.325
3D body: height 0.2, standoff 0, extent 5.5,-8.602 6.1,-8.302
3D body: height 0.85, standoff 0.65, extent 5.1,-8.602 5.5,-8.302
3D body: height 0.85, standoff 0, extent 5.4,-8.602 5.6,-8.302
3D body: height 0.85, standoff 0, extent 5.4,-7.952 5.6,-7.652
3D body: height 0.85, standoff 0.65, extent 5.1,-7.952 5.5,-7.652
3D body: height 0.2, standoff 0, extent 5.5,-7.952 6.1,-7.652
3D body: height 0.2, standoff 0, extent 5.5,-6.001 6.1,-5.701
3D body: height 0.85, standoff 0.65, extent 5.1,-6.001 5.5,-5.701
3D body: height 0.85, standoff 0, extent 5.4,-6.001 5.6,-5.701
3D body: height 0.85, standoff 0, extent 5.4,-5.351 5.6,-5.051
3D body: height 0.85, standoff 0.65, extent 5.1,-5.351 5.5,-5.051
3D body: height 0.2, standoff 0, extent 5.5,-5.351 6.1,-5.051
3D body: height 0.2, standoff 0, extent 5.5,-7.302 6.1,-7.002
3D body: height 0.85, standoff 0.65, extent 5.1,-7.302 5.5,-7.002
3D body: height 0.85, standoff 0, extent 5.4,-7.302 5.6,-7.002
3D body: height 0.85, standoff 0, extent 5.4,-6.652 5.6,-6.352
3D body: height 0.85, standoff 0.65, extent 5.1,-6.652 5.5,-6.352
3D body: height 0.2, standoff 0, extent 5.5,-6.652 6.1,-6.352
3D body: height 0.2, standoff 0, extent 5.5,-3.401 6.1,-3.101
3D body: height 0.85, standoff 0.65, extent 5.1,-3.401 5.5,-3.101
3D body: height 0.85, standoff 0, extent 5.4,-3.401 5.6,-3.101
3D body: height 0.85, standoff 0, extent 5.4,-2.751 5.6,-2.451
3D body: height 0.85, standoff 0.65, extent 5.1,-2.751 5.5,-2.451
3D body: height 0.2, standoff 0, extent 5.5,-2.751 6.1,-2.451
3D body: height 0.2, standoff 0, extent 5.5,-4.701 6.1,-4.401
3D body: height 0.85, standoff 0.65, extent 5.1,-4.701 5.5,-4.401
3D body: height 0.85, standoff 0, extent 5.4,-4.701 5.6,-4.401
3D body: height 0.85, standoff 0, extent 5.4,-4.051 5.6,-3.751
3D body: height 0.85, standoff 0.65, extent 5.1,-4.051 5.5,-3.751
3D body: height 0.2, standoff 0, extent 5.5,-4.051 6.1,-3.751
3D body: height 0.2, standoff 0, extent -0.5,-5.351 0.1,-5.051
3D body: height 0.85, standoff 0.65, extent 0.1,-5.351 0.5,-5.051
3D body: height 0.85, standoff 0, extent 0,-5.351 0.2,-5.051
3D body: height 0.2, standoff 0, extent -0.5,-7.302 0.1,-7.002
3D body: height 0.85, standoff 0.65, extent 0.1,-7.302 0.5,-7.002
3D body: height 0.85, standoff 0, extent 0,-7.302 0.2,-7.002
3D body: height 0.85, standoff 0, extent 0,-7.952 0.2,-7.652
3D body: height 0.85, standoff 0.65, extent 0.1,-7.952 0.5,-7.652
3D body: height 0.2, standoff 0, extent -0.5,-7.952 0.1,-7.652
3D body: height 0.85, standoff 0, extent 0,-8.602 0.2,-8.302
3D body: height 0.85, standoff 0.65, extent 0.1,-8.602 0.5,-8.302
3D body: height 0.2, standoff 0, extent -0.5,-8.602 0.1,-8.302
3D body: height 0.85, standoff 0, extent 0,-6.001 0.2,-5.701
3D body: height 0.85, standoff 0.65, extent 0.1,-6.001 0.5,-5.701
3D body: height 0.2, standoff 0, extent -0.5,-6.001 0.1,-5.701
3D body: height 0.85, standoff 0, extent 0,-6.652 0.2,-6.352
3D body: height 0.85, standoff 0.65, extent 0.1,-6.652 0.5,-6.352
3D body: height 0.2, standoff 0, extent -0.5,-6.652 0.1,-6.352
3D body: height 0.2, standoff 0, extent 5.5,-1.45 6.1,-1.15
3D body: height 0.85, standoff 0.65, extent 5.1,-1.45 5.5,-1.15
3D body: height 0.85, standoff 0, extent 5.4,-1.45 5.6,-1.15
3D body: height 0.85, standoff 0, extent 5.4,-2.1 5.6,-1.8
3D body: height 0.85, standoff 0.65, extent 5.1,-2.1 5.5,-1.8
3D body: height 0.2, standoff 0, extent 5.5,-2.1 6.1,-1.8
3D body: height 1.21, standoff 1.2, extent 1.001,-0.475 1.6,0.125
3D body: height 0.2, standoff 0, extent 5.5,-0.15 6.1,0.15
3D body: height 0.85, standoff 0.65, extent 5.1,-0.15 5.5,0.15
3D body: height 0.85, standoff 0, extent 5.4,-0.15 5.6,0.15
3D body: height 0.85, standoff 0, extent 5.4,-0.8 5.6,-0.5
3D body: height 0.85, standoff 0.65, extent 5.1,-0.8 5.5,-0.5
3D body: height 0.2, standoff 0, extent 5.5,-0.8 6.1,-0.5
3D body: height 0.2, standoff 0, extent -0.5,-0.8 0.1,-0.5
3D body: height 0.85, standoff 0.65, extent 0.1,-0.8 0.5,-0.5
3D body: height 0.85, standoff 0, extent 0,-0.8 0.2,-0.5
3D body: height 0.85, standoff 0, extent 0,-1.45 0.2,-1.15
3D body: height 0.85, standoff 0.65, extent 0.1,-1.45 0.5,-1.15
3D body: height 0.2, standoff 0, extent -0.5,-1.45 0.1,-1.15
3D body: height 0.85, standoff 0, extent 0,-0.15 0.2,0.15
3D body: height 0.85, standoff 0.65, extent 0.1,-0.15 0.5,0.15
3D body: height 0.2, standoff 0, extent -0.5,-0.15 0.1,0.15
3D body: height 0.85, standoff 0, extent 0,-2.1 0.2,-1.8
3D body: height 0.85, standoff 0.65, extent 0.1,-2.1 0.5,-1.8
3D body: height 0.2, standoff 0, extent -0.5,-2.1 0.1,-1.8
3D body: height 1.2, standoff 0.15, extent 0.5,-9 5.1,0.525
3D body: height 0.2, standoff 0, extent -0.5,-4.051 0.1,-3.751
3D body: height 0.85, standoff 0.65, extent 0.1,-4.051 0.5,-3.751
3D body: height 0.85, standoff 0, extent 0,-4.051 0.2,-3.751
3D body: height 0.2, standoff 0, extent -0.5,-3.401 0.1,-3.101
3D body: height 0.85, standoff 0.65, extent 0.1,-3.401 0.5,-3.101
3D body: height 0.85, standoff 0, extent 0,-3.401 0.2,-3.101
3D body: height 0.85, standoff 0, extent 0,-2.751 0.2,-2.451
3D body: height 0.85, standoff 0.65, extent 0.1,-2.751 0.5,-2.451
3D body: height 0.2, standoff 0, extent -0.5,-2.751 0.1,-2.451
3D body: height 0.85, standoff 0, extent 0,-4.701 0.2,-4.401
3D body: height 0.85, standoff 0.65, extent 0.1,-4.701 0.5,-4.401
3D body: height 0.2, standoff 0, extent -0.5,-4.701 0.1,-4.401

## TSSOP-8 [mm]
pads (8):
  rect 1.2x0.4 smd: 1(0,0) 2(0,-0.65) 3(0,-1.3) 4(0,-1.95) 5(5.6,-1.95) 6(5.6,-1.3) 7(5.6,-0.65) 8(5.6,0)
Top Overlay:
  lines w0.1: 0.8,-2.275 2.8,-2.275 4.8,-2.275 ; 0.8,0.325 2.338,0.325 ccw(c2.8,0.325) 3.262,0.325 4.8,0.325
3D body: height 1.21, standoff 1.2, extent 1.001,-0.475 1.6,0.125
3D body: height 0.2, standoff 0, extent 5.5,-2.1 6.1,-1.8
3D body: height 0.85, standoff 0.65, extent 5.1,-2.1 5.5,-1.8
3D body: height 0.85, standoff 0, extent 5.4,-2.1 5.6,-1.8
3D body: height 0.2, standoff 0, extent 5.5,-0.15 6.1,0.15
3D body: height 0.85, standoff 0.65, extent 5.1,-0.15 5.5,0.15
3D body: height 0.85, standoff 0, extent 5.4,-0.15 5.6,0.15
3D body: height 0.2, standoff 0, extent 5.5,-1.45 6.1,-1.15
3D body: height 0.85, standoff 0.65, extent 5.1,-1.45 5.5,-1.15
3D body: height 0.85, standoff 0, extent 5.4,-1.45 5.6,-1.15
3D body: height 0.85, standoff 0, extent 5.4,-0.8 5.6,-0.5
3D body: height 0.85, standoff 0.65, extent 5.1,-0.8 5.5,-0.5
3D body: height 0.2, standoff 0, extent 5.5,-0.8 6.1,-0.5
3D body: height 0.2, standoff 0, extent -0.5,-0.8 0.1,-0.5
3D body: height 0.85, standoff 0.65, extent 0.1,-0.8 0.5,-0.5
3D body: height 0.85, standoff 0, extent 0,-0.8 0.2,-0.5
3D body: height 0.85, standoff 0, extent 0,-1.45 0.2,-1.15
3D body: height 0.85, standoff 0.65, extent 0.1,-1.45 0.5,-1.15
3D body: height 0.2, standoff 0, extent -0.5,-1.45 0.1,-1.15
3D body: height 0.85, standoff 0, extent 0,-0.15 0.2,0.15
3D body: height 0.85, standoff 0.65, extent 0.1,-0.15 0.5,0.15
3D body: height 0.2, standoff 0, extent -0.5,-0.15 0.1,0.15
3D body: height 0.85, standoff 0, extent 0,-2.1 0.2,-1.8
3D body: height 0.85, standoff 0.65, extent 0.1,-2.1 0.5,-1.8
3D body: height 0.2, standoff 0, extent -0.5,-2.1 0.1,-1.8
3D body: height 1.2, standoff 0.15, extent 0.5,-2.475 5.1,0.525

## TSSOP-14 [mm]
pads (14):
  rect 1.2x0.4 smd: 1(-2.8,1.95) 2(-2.8,1.3) 3(-2.8,0.65) 4(-2.8,0) 5(-2.8,-0.65) 6(-2.8,-1.3) 7(-2.8,-1.95) 8(2.8,-1.95) 9(2.8,-1.3) 10(2.8,-0.65) 11(2.8,0) 12(2.8,0.65) 13(2.8,1.3) 14(2.8,1.95)
Top Overlay:
  lines w0.1: -2,-2.275 0,-2.275 2,-2.275 ; -2,2.275 -0.462,2.275 ccw(c0,2.275) 0.462,2.275 2,2.275
3D body: height 0.2, standoff 0, extent 2.7,-2.1 3.3,-1.8
3D body: height 0.85, standoff 0.65, extent 2.3,-2.1 2.7,-1.8
3D body: height 0.85, standoff 0, extent 2.6,-2.1 2.8,-1.8
3D body: height 0.2, standoff 0, extent 2.7,-1.45 3.3,-1.15
3D body: height 0.85, standoff 0.65, extent 2.3,-1.45 2.7,-1.15
3D body: height 0.85, standoff 0, extent 2.6,-1.45 2.8,-1.15
3D body: height 0.85, standoff 0, extent 2.6,-0.8 2.8,-0.5
3D body: height 0.85, standoff 0.65, extent 2.3,-0.8 2.7,-0.5
3D body: height 0.2, standoff 0, extent 2.7,-0.8 3.3,-0.5
3D body: height 1.2, standoff 0.15, extent -2.3,-2.5 2.3,2.5
3D body: height 0.2, standoff 0, extent -3.3,-0.15 -2.7,0.15
3D body: height 0.85, standoff 0.65, extent -2.7,-0.15 -2.3,0.15
3D body: height 0.85, standoff 0, extent -2.8,-0.15 -2.6,0.15
3D body: height 0.2, standoff 0, extent -3.3,1.8 -2.7,2.1
3D body: height 0.85, standoff 0.65, extent -2.7,1.8 -2.3,2.1
3D body: height 0.85, standoff 0, extent -2.8,1.8 -2.6,2.1
3D body: height 0.2, standoff 0, extent -3.3,0.5 -2.7,0.8
3D body: height 0.85, standoff 0.65, extent -2.7,0.5 -2.3,0.8
3D body: height 0.85, standoff 0, extent -2.8,0.5 -2.6,0.8
3D body: height 0.85, standoff 0, extent -2.8,1.15 -2.6,1.45
3D body: height 0.85, standoff 0.65, extent -2.7,1.15 -2.3,1.45
3D body: height 0.2, standoff 0, extent -3.3,1.15 -2.7,1.45
3D body: height 0.2, standoff 0, extent 2.7,1.15 3.3,1.45
3D body: height 0.85, standoff 0.65, extent 2.3,1.15 2.7,1.45
3D body: height 0.85, standoff 0, extent 2.6,1.15 2.8,1.45
3D body: height 0.85, standoff 0, extent 2.6,0.5 2.8,0.8
3D body: height 0.85, standoff 0.65, extent 2.3,0.5 2.7,0.8
3D body: height 0.2, standoff 0, extent 2.7,0.5 3.3,0.8
3D body: height 0.85, standoff 0, extent 2.6,1.8 2.8,2.1
3D body: height 0.85, standoff 0.65, extent 2.3,1.8 2.7,2.1
3D body: height 0.2, standoff 0, extent 2.7,1.8 3.3,2.1
3D body: height 0.85, standoff 0, extent 2.6,-0.15 2.8,0.15
3D body: height 0.85, standoff 0.65, extent 2.3,-0.15 2.7,0.15
3D body: height 0.2, standoff 0, extent 2.7,-0.15 3.3,0.15
3D body: height 1.21, standoff 1.2, extent -1.799,1.476 -1.2,2.075
3D body: height 0.2, standoff 0, extent -3.3,-0.8 -2.7,-0.5
3D body: height 0.85, standoff 0.65, extent -2.7,-0.8 -2.3,-0.5
3D body: height 0.85, standoff 0, extent -2.8,-0.8 -2.6,-0.5
3D body: height 0.85, standoff 0, extent -2.8,-1.45 -2.6,-1.15
3D body: height 0.85, standoff 0.65, extent -2.7,-1.45 -2.3,-1.15
3D body: height 0.2, standoff 0, extent -3.3,-1.45 -2.7,-1.15
3D body: height 0.85, standoff 0, extent -2.8,-2.1 -2.6,-1.8
3D body: height 0.85, standoff 0.65, extent -2.7,-2.1 -2.3,-1.8
3D body: height 0.2, standoff 0, extent -3.3,-2.1 -2.7,-1.8

## UFQFPN20 [mm]
pads (20):
  oval 0.3x0.45 smd: 1(-1,-1.425) 5(1,-1.425) 11(1,1.425) 15(-1,1.425)
  oval 0.3x0.7 smd: 2(-0.5,-1.3) 3(0,-1.3) 4(0.5,-1.3) 12(0.5,1.3) 13(0,1.3) 14(-0.5,1.3)
  oval 0.45x0.3 smd: 6(1.425,-1) 10(1.425,1) 16(-1.425,1) 20(-1.425,-1)
  oval 0.7x0.3 smd: 7(1.3,-0.5) 8(1.3,0) 9(1.3,0.5) 17(-1.3,0.5) 18(-1.3,0) 19(-1.3,-0.5)
Top Overlay:
  circle w0.254: c-0.91,-0.895 r0.036
3D body: height 0.2, standoff 0, extent -1.51,-0.125 -1.035,0.125
3D body: height 0.2, standoff 0, extent -1.51,-0.625 -1.035,-0.375
3D body: height 0.2, standoff 0, extent -1.51,0.375 -1.035,0.625
3D body: height 0.2, standoff 0, extent -0.625,1.035 -0.375,1.51
3D body: height 0.2, standoff 0, extent -0.125,1.035 0.125,1.51
3D body: height 0.2, standoff 0, extent 0.375,1.035 0.625,1.51
3D body: height 0.2, standoff 0, extent 1.035,0.375 1.51,0.625
3D body: height 0.2, standoff 0, extent 1.035,-0.125 1.51,0.125
3D body: height 0.2, standoff 0, extent 1.035,-0.625 1.51,-0.375
3D body: height 0.2, standoff 0, extent 0.375,-1.51 0.625,-1.035
3D body: height 0.2, standoff 0, extent -0.125,-1.51 0.125,-1.035
3D body: height 0.2, standoff 0, extent 0.875,-1.51 1.125,-1.275
3D body: height 0.2, standoff 0, extent 1.275,-1.125 1.51,-0.875
3D body: height 0.2, standoff 0, extent 1.275,0.875 1.51,1.125
3D body: height 0.2, standoff 0, extent 0.875,1.275 1.125,1.51
3D body: height 0.2, standoff 0, extent -1.125,1.275 -0.875,1.51
3D body: height 0.2, standoff 0, extent -1.51,0.875 -1.275,1.125
3D body: height 0.2, standoff 0, extent -1.51,-1.125 -1.275,-0.875
3D body: height 0.2, standoff 0, extent -1.125,-1.51 -0.875,-1.275
3D body: height 0.61, standoff 0.6, extent -1.223,-1.199 -0.825,-0.8
3D body: height 0.2, standoff 0, extent -0.625,-1.51 -0.375,-1.035
3D body: height 0.6, standoff 0.02, extent -1.5,-1.5 1.5,1.5

## UMLP-10 [mm]
pads (10):
  rect 0.55x0.225 smd: 1(-0.45,0.2)
  rect 0.45x0.225 smd: 2(-0.5,-0.2) 6(0.5,-0.2) 7(0.5,0.2)
  rect 0.225x0.45 smd: 3(-0.4,-0.7) 4(0,-0.7) 5(0.4,-0.7) 8(0.4,0.7) 9(0,0.7) 10(-0.4,0.7)
Top Overlay:
  lines w0.1: -0.625,0.515 -0.625,0.79
3D body: height 0.51, standoff 0.5, extent -0.549,0.465 -0.25,0.765
3D body: height 0.5, standoff 0.04, extent -0.7,-0.9 0.7,0.9
3D body: height 0.15, standoff 0, extent -0.705,0.1 -0.305,0.3
3D body: height 0.15, standoff 0, extent -0.705,-0.3 -0.305,-0.1
3D body: height 0.15, standoff 0, extent -0.5,-0.905 -0.3,-0.505
3D body: height 0.15, standoff 0, extent -0.1,-0.905 0.1,-0.505
3D body: height 0.15, standoff 0, extent 0.3,-0.905 0.5,-0.505
3D body: height 0.15, standoff 0, extent 0.305,-0.3 0.705,-0.1
3D body: height 0.15, standoff 0, extent 0.305,0.1 0.705,0.3
3D body: height 0.15, standoff 0, extent 0.3,0.505 0.5,0.905
3D body: height 0.15, standoff 0, extent -0.1,0.505 0.1,0.905
3D body: height 0.15, standoff 0, extent -0.5,0.505 -0.3,0.905
3D body: height 0.15, standoff 0, extent -0.655,0.1 -0.255,0.3

## USB 3.0 Double [mm]
pads (22):
  round 1.2 hole 0.7: 1(2,3.5) 2(2,1) 3(2,-1) 4(2,-3.5) 5(3.5,-4) 6(3.5,-2) 7(3.5,0) 8(3.5,2) 9(3.5,4) 10(5.2,3.5) 11(5.2,1) 12(5.2,-1) 13(5.2,-3.5) 14(6.7,-4) 15(6.7,-2) 16(6.7,0) 17(6.7,2) 18(6.7,4)
  oval 3.1x2.1 hole 1.2 slot 2.1 at 0 deg: G(0,-6.57) G(0,6.57) G(5.68,-6.57) G(5.68,6.57)
3D body: height 15.5, standoff 15.3, extent -9.45,-6 -3.05,6
3D body: height 15.5, standoff 15.3, extent -9.05,-6 0.25,6
3D body: height 15.5, standoff 15.3, extent -3.05,-6 7.65,6
3D body: height 15.5, standoff 1.43, extent 7.65,-6.2 7.85,6.2
3D body: height 1.57, standoff 1.27, extent -9.65,-6 7.85,6
3D body: height 10.07, standoff 9.63, extent -9.65,-6 7.85,6
3D body: height 6.99, standoff 6.69, extent -9.65,-6 7.85,6
3D body: height 15, standoff 2.13, extent -9.65,-7.25 -9.45,-6
3D body: height 15.5, standoff 1.27, extent -9.65,-6.2 7.85,-6
3D body: height 15.5, standoff 1.27, extent -9.65,6 7.85,6.2
3D body: height 10.07, standoff 6.69, extent -9.65,-6 -9.45,6
3D body: height 1.57, standoff 0.4, extent -9.65,-5.8 -9.45,5.8
3D body: height 16.19, standoff 15.3, extent -9.65,-5.8 -9.45,5.8
3D body: height 15, standoff 2.1, extent -9.65,6 -9.45,7.25
3D body: height 12.8, standoff 12.3, extent -7.05,-4 -1.05,-3
3D body: height 14.8, standoff 12.8, extent -8.75,-5.5 0.25,5.5
3D body: height 15.3, standoff 0, extent -1.45,-6 7.65,6
3D body: height 12.8, standoff 12.3, extent -7.05,-1.5 -1.05,-0.5
3D body: height 12.8, standoff 12.3, extent -7.05,0.5 -1.05,1.5
3D body: height 12.8, standoff 12.3, extent -7.05,3 -1.05,4
3D body: height 4.1, standoff 3.6, extent -7.05,3 -1.05,4
3D body: height 4.1, standoff 3.6, extent -7.05,0.5 -1.05,1.5
3D body: height 4.1, standoff 3.6, extent -7.05,-1.5 -1.05,-0.5
3D body: height 6.1, standoff 4.1, extent -8.75,-5.5 0.25,5.5
3D body: height 4.1, standoff 3.6, extent -7.05,-4 -1.05,-3
3D body: height 0.6, standoff -2, extent 1.9,3.25 2.1,3.75
3D body: height 0.6, standoff -2, extent 1.9,0.75 2.1,1.25
3D body: height 0.6, standoff -2, extent 1.9,-1.25 2.1,-0.75
3D body: height 0.6, standoff -2, extent 1.9,-3.75 2.1,-3.25
3D body: height 0.6, standoff -2, extent 3.4,3.75 3.6,4.25
3D body: height 0.6, standoff -2, extent 3.4,1.75 3.6,2.25
3D body: height 0.6, standoff -2, extent 3.4,-0.25 3.6,0.25
3D body: height 0.6, standoff -2, extent 3.4,-2.25 3.6,-1.75
3D body: height 0.6, standoff -2, extent 3.4,-4.25 3.6,-3.75
3D body: height 0.6, standoff -2, extent 5.1,-3.75 5.3,-3.25
3D body: height 0.6, standoff -2, extent 5.1,-1.25 5.3,-0.75
3D body: height 0.6, standoff -2, extent 5.1,0.75 5.3,1.25
3D body: height 0.6, standoff -2, extent 5.1,3.25 5.3,3.75
3D body: height 0.6, standoff -2, extent 6.6,3.75 6.8,4.25
3D body: height 0.6, standoff -2, extent 6.6,1.75 6.8,2.25
3D body: height 0.6, standoff -2, extent 6.6,-0.25 6.8,0.25
3D body: height 0.6, standoff -2, extent 6.6,-2.25 6.8,-1.75
3D body: height 0.6, standoff -2, extent 6.6,-4.25 6.8,-3.75